# Altium footprint library my_PcbLib.PcbLib: 58 footprints (part 1 of 4)
Each footprint in its own frame and in the unit in brackets; x right, y up, seen from the top. Pads: shape width x height; smd on the part's side, far side on the other; paste and mask are expansions set on the pad; w line width, h text height; cw(c..) or ccw(c..) is an arc to the next point about the centre after c.
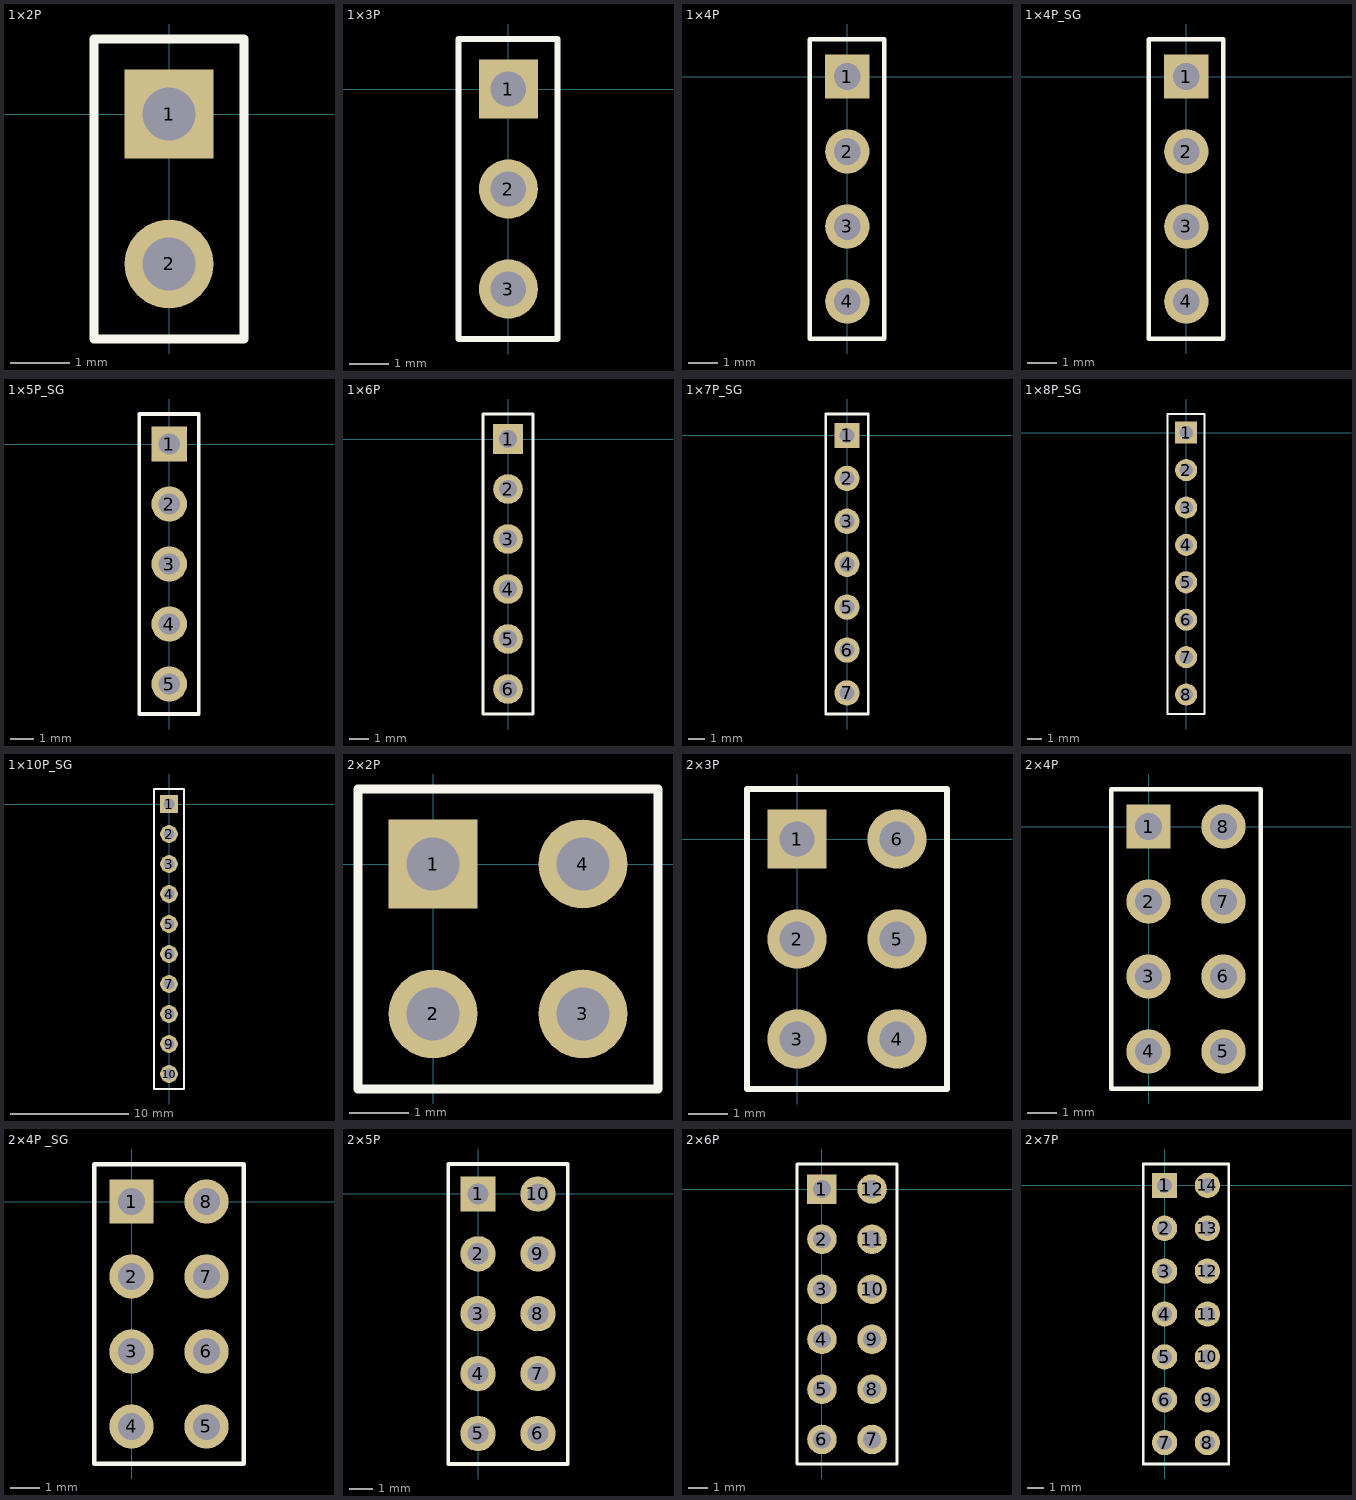
[diagram p0: the footprints below, top view; thin cyan lines are the x and y axes]

## 1×2P [mm]
pads (2):
  rect 1.5x1.5 hole 0.9: 1(0,0)
  round 1.5 hole 0.9: 2(0,-2.54)
Top Overlay:
  lines w0.152: -1.27,-3.81 -1.27,1.27 1.27,1.27 1.27,-3.81 -1.27,-3.81
3D body "User Library-HEADER 2x1 Pitch 2_54x2_54.STEP": height 7.11, standoff -4.19, extent -1.27,-3.81 1.27,1.27

## 1×3P [mm]
pads (3):
  rect 1.5x1.5 hole 0.9: 1(0,0)
  round 1.5 hole 0.9: 2(0,-2.54) 3(0,-5.08)
Top Overlay:
  lines w0.152: -1.27,-6.35 -1.27,1.27 1.25,1.27 1.25,-6.35 -1.27,-6.35
3D body "User Library-PLS-3.STEP": height 8.54, standoff -3, extent -1.27,-6.35 1.27,1.27

## 1×4P [mm]
pads (4):
  rect 1.5x1.5 hole 0.9: 1(0,0)
  round 1.5 hole 0.9: 2(0,-2.54) 3(0,-5.08) 4(0,-7.62)
Top Overlay:
  lines w0.152: -1.27,-8.89 1.25,-8.89 1.25,1.27 -1.27,1.27 -1.27,-8.89
3D body "User Library-HEADER 2x1 Pitch 2_54x2_54.STEP": height 7.11, standoff -4.19, extent -1.295,-3.835 1.245,1.245
3D body "User Library-HEADER 2x1 Pitch 2_54x2_54.STEP": height 7.11, standoff -4.19, extent -1.295,-8.915 1.245,-3.835

## 1×4P_SG [mm]
pads (4):
  rect 1.5x1.5 hole 0.9: 1(0,0)
  round 1.5 hole 0.9: 2(0,-2.54) 3(0,-5.08) 4(0,-7.62)
Top Overlay:
  lines w0.152: -1.27,-8.89 1.25,-8.89 1.25,1.27 -1.27,1.27 -1.27,-8.89
3D body "User Library-ZL262-4SG.STEP": height 8.4, standoff -3.15, extent -1.25,-8.89 1.25,1.27

## 1×5P_SG [mm]
pads (5):
  rect 1.5x1.5 hole 0.9: 1(0,0)
  round 1.5 hole 0.9: 2(0,-2.54) 3(0,-5.08) 4(0,-7.62) 5(0,-10.16)
Top Overlay:
  lines w0.152: -1.27,-11.43 -1.27,1.27 1.25,1.27 1.25,-11.43 -1.27,-11.43
3D body "User Library-PBS-05.STEP": height 8.4, standoff -3.2, extent -1.27,-11.43 1.27,1.27

## 1×6P [mm]
pads (6):
  rect 1.5x1.5 hole 0.9: 1(0,0)
  round 1.5 hole 0.9: 2(0,-2.54) 3(0,-5.08) 4(0,-7.62) 5(0,-10.16) 6(0,-12.7)
Top Overlay:
  lines w0.152: -1.27,-13.97 1.27,-13.97 1.27,1.27 -1.27,1.27 -1.27,-13.97
3D body "User Library-PLS-6-1.STEP": height 8.54, standoff -3, extent -1.27,-13.97 1.27,1.27

## 1×7P_SG [mm]
pads (7):
  rect 1.5x1.5 hole 0.9: 1(0,0)
  round 1.5 hole 0.9: 2(0,-2.54) 3(0,-5.08) 4(0,-7.62) 5(0,-10.16) 6(0,-12.7) 7(0,-15.24)
Top Overlay:
  lines w0.152: -1.27,-16.485 1.27,-16.485 1.27,1.27 -1.27,1.27 -1.27,-16.485
3D body "User Library-PBS-07.STEP": height 8.4, standoff -3.2, extent -1.27,-16.485 1.27,1.295

## 1×8P_SG [mm]
pads (8):
  rect 1.5x1.5 hole 0.9: 1(0,0)
  round 1.5 hole 0.9: 2(0,-2.54) 3(0,-5.08) 4(0,-7.62) 5(0,-10.16) 6(0,-12.7) 7(0,-15.24) 8(0,-17.78)
Top Overlay:
  lines w0.152: -1.27,-19.101 1.25,-19.101 1.25,1.27 -1.27,1.27 -1.27,-19.101
3D body "User Library-ZL262-4SG.STEP": height 8.4, standoff -3.15, extent -1.25,-8.89 1.25,1.27
3D body "User Library-ZL262-4SG.STEP": height 8.4, standoff -3.15, extent -1.25,-19.05 1.25,-8.89

## 1×10P_SG [mm]
pads (10):
  rect 1.5x1.5 hole 0.9: 1(0,0)
  round 1.5 hole 0.9: 2(0,-2.54) 3(0,-5.08) 4(0,-7.62) 5(0,-10.16) 6(0,-12.7) 7(0,-15.24) 8(0,-17.78) 9(0,-20.32) 10(0,-22.86)
Top Overlay:
  lines w0.152: -1.27,-24.13 1.27,-24.13 1.27,1.27 -1.27,1.27 -1.27,-24.13
3D body "User Library-ZL262-10SG.STEP": height 8.4, standoff -3.15, extent -1.27,-24.13 1.23,1.27

## 2×2P [mm]
pads (4):
  rect 1.5x1.5 hole 0.9: 1(0,0)
  round 1.5 hole 0.9: 2(0,-2.54) 3(2.54,-2.54) 4(2.54,0)
Top Overlay:
  lines w0.152: -1.27,-3.81 -1.27,1.27 3.81,1.27 3.81,-3.81 -1.27,-3.81
3D body "User Library-PLD-xxPLD-4.STEP": height 8.4, standoff -3, extent -1.27,-3.81 3.73,1.27

## 2×3P [mm]
pads (6):
  rect 1.5x1.5 hole 0.9: 1(0,0)
  round 1.5 hole 0.9: 2(0,-2.54) 3(0,-5.08) 4(2.54,-5.08) 5(2.54,-2.54) 6(2.54,0)
Top Overlay:
  lines w0.152: -1.27,-6.35 3.81,-6.35 3.81,1.27 -1.27,1.27 -1.27,-6.35
3D body "User Library-HEADER 2x1 Pitch 2_54x2_54.STEP": height 7.11, standoff -4.19, extent -1.27,-6.35 3.81,-3.81
3D body "User Library-HEADER 2x1 Pitch 2_54x2_54.STEP": height 7.11, standoff -4.19, extent -1.27,-3.81 3.81,-1.27
3D body "User Library-HEADER 2x1 Pitch 2_54x2_54.STEP": height 7.11, standoff -4.19, extent -1.27,-1.27 3.81,1.27

## 2×4P [mm]
pads (8):
  rect 1.5x1.5 hole 0.9: 1(0,0)
  round 1.5 hole 0.9: 2(0,-2.54) 3(0,-5.08) 4(0,-7.62) 5(2.54,-7.62) 6(2.54,-5.08) 7(2.54,-2.54) 8(2.54,0)
Top Overlay:
  lines w0.152: -1.27,-8.89 3.81,-8.89 3.81,1.27 -1.27,1.27 -1.27,-8.89
3D body "User Library-HEADER 2x1 Pitch 2_54x2_54.STEP": height 7.11, standoff -4.19, extent -1.27,-8.89 3.81,-6.35
3D body "User Library-HEADER 2x1 Pitch 2_54x2_54.STEP": height 7.11, standoff -4.19, extent -1.27,-6.35 3.81,-3.81
3D body "User Library-HEADER 2x1 Pitch 2_54x2_54.STEP": height 7.11, standoff -4.19, extent -1.27,-3.81 3.81,-1.27
3D body "User Library-HEADER 2x1 Pitch 2_54x2_54.STEP": height 7.11, standoff -4.19, extent -1.27,-1.27 3.81,1.27

## 2×4P _SG [mm]
pads (8):
  rect 1.5x1.5 hole 0.9: 1(0,0)
  round 1.5 hole 0.9: 2(0,-2.54) 3(0,-5.08) 4(0,-7.62) 5(2.54,-7.62) 6(2.54,-5.08) 7(2.54,-2.54) 8(2.54,0)
Top Overlay:
  lines w0.152: -1.27,-8.89 -1.27,1.27 3.81,1.27 3.81,-8.89 -1.27,-8.89
3D body "User Library-ZL262-4SG.STEP": height 8.4, standoff -3.15, extent -1.241,-8.89 1.259,1.27
3D body "User Library-ZL262-4SG.STEP": height 8.4, standoff -3.15, extent 1.259,-8.89 3.759,1.27

## 2×5P [mm]
pads (10):
  rect 1.5x1.5 hole 0.9: 1(0,0)
  round 1.5 hole 0.9: 2(0,-2.54) 3(0,-5.08) 4(0,-7.62) 5(0,-10.16) 6(2.54,-10.16) 7(2.54,-7.62) 8(2.54,-5.08) 9(2.54,-2.54) 10(2.54,0)
Top Overlay:
  lines w0.152: -1.27,-11.455 3.81,-11.455 3.81,1.27 -1.27,1.27 -1.27,-11.455
3D body "User Library-PLD-xxPLD-10.STEP": height 8.4, standoff -3, extent -1.23,-11.43 3.77,1.27

## 2×6P [mm]
pads (12):
  rect 1.5x1.5 hole 0.9: 1(0,0)
  round 1.5 hole 0.9: 2(0,-2.54) 3(0,-5.08) 4(0,-7.62) 5(0,-10.16) 6(0,-12.7) 7(2.54,-12.7) 8(2.54,-10.16) 9(2.54,-7.62) 10(2.54,-5.08) 11(2.54,-2.54) 12(2.54,0)
Top Overlay:
  lines w0.152: -1.27,-13.945 -1.27,1.27 3.81,1.27 3.81,-13.945 -1.27,-13.945
3D body "User Library-PLS-6-1.STEP": height 8.54, standoff -3, extent 1.27,-13.97 3.81,1.27
3D body "User Library-PLS-6-1.STEP": height 8.54, standoff -3, extent -1.27,-13.97 1.27,1.27

## 2×7P [mm]
pads (14):
  rect 1.5x1.5 hole 0.9: 1(0,0)
  round 1.5 hole 0.9: 2(0,-2.54) 3(0,-5.08) 4(0,-7.62) 5(0,-10.16) 6(0,-12.7) 7(0,-15.24) 8(2.54,-15.24) 9(2.54,-12.7) 10(2.54,-10.16) 11(2.54,-7.62) 12(2.54,-5.08) 13(2.54,-2.54) 14(2.54,0)
Top Overlay:
  lines w0.152: -1.27,-16.51 -1.27,1.27 3.81,1.27 3.81,-16.51 -1.27,-16.51
3D body "User Library-PLD-xxPLD-6.STEP": height 8.4, standoff -3, extent -1.23,-6.35 3.77,1.27
3D body "User Library-PLD-xxPLD-8.STEP": height 8.4, standoff -3, extent -1.23,-16.51 3.77,-6.35